# Altium footprint library Connecteurs_Wurth.PcbLib: 33 footprints (part 2 of 3)
Each footprint in its own frame and in the unit in brackets; x right, y up, seen from the top. Pads: shape width x height; smd on the part's side, far side on the other; paste and mask are expansions set on the pad; w line width, h text height; cw(c..) or ccw(c..) is an arc to the next point about the centre after c.
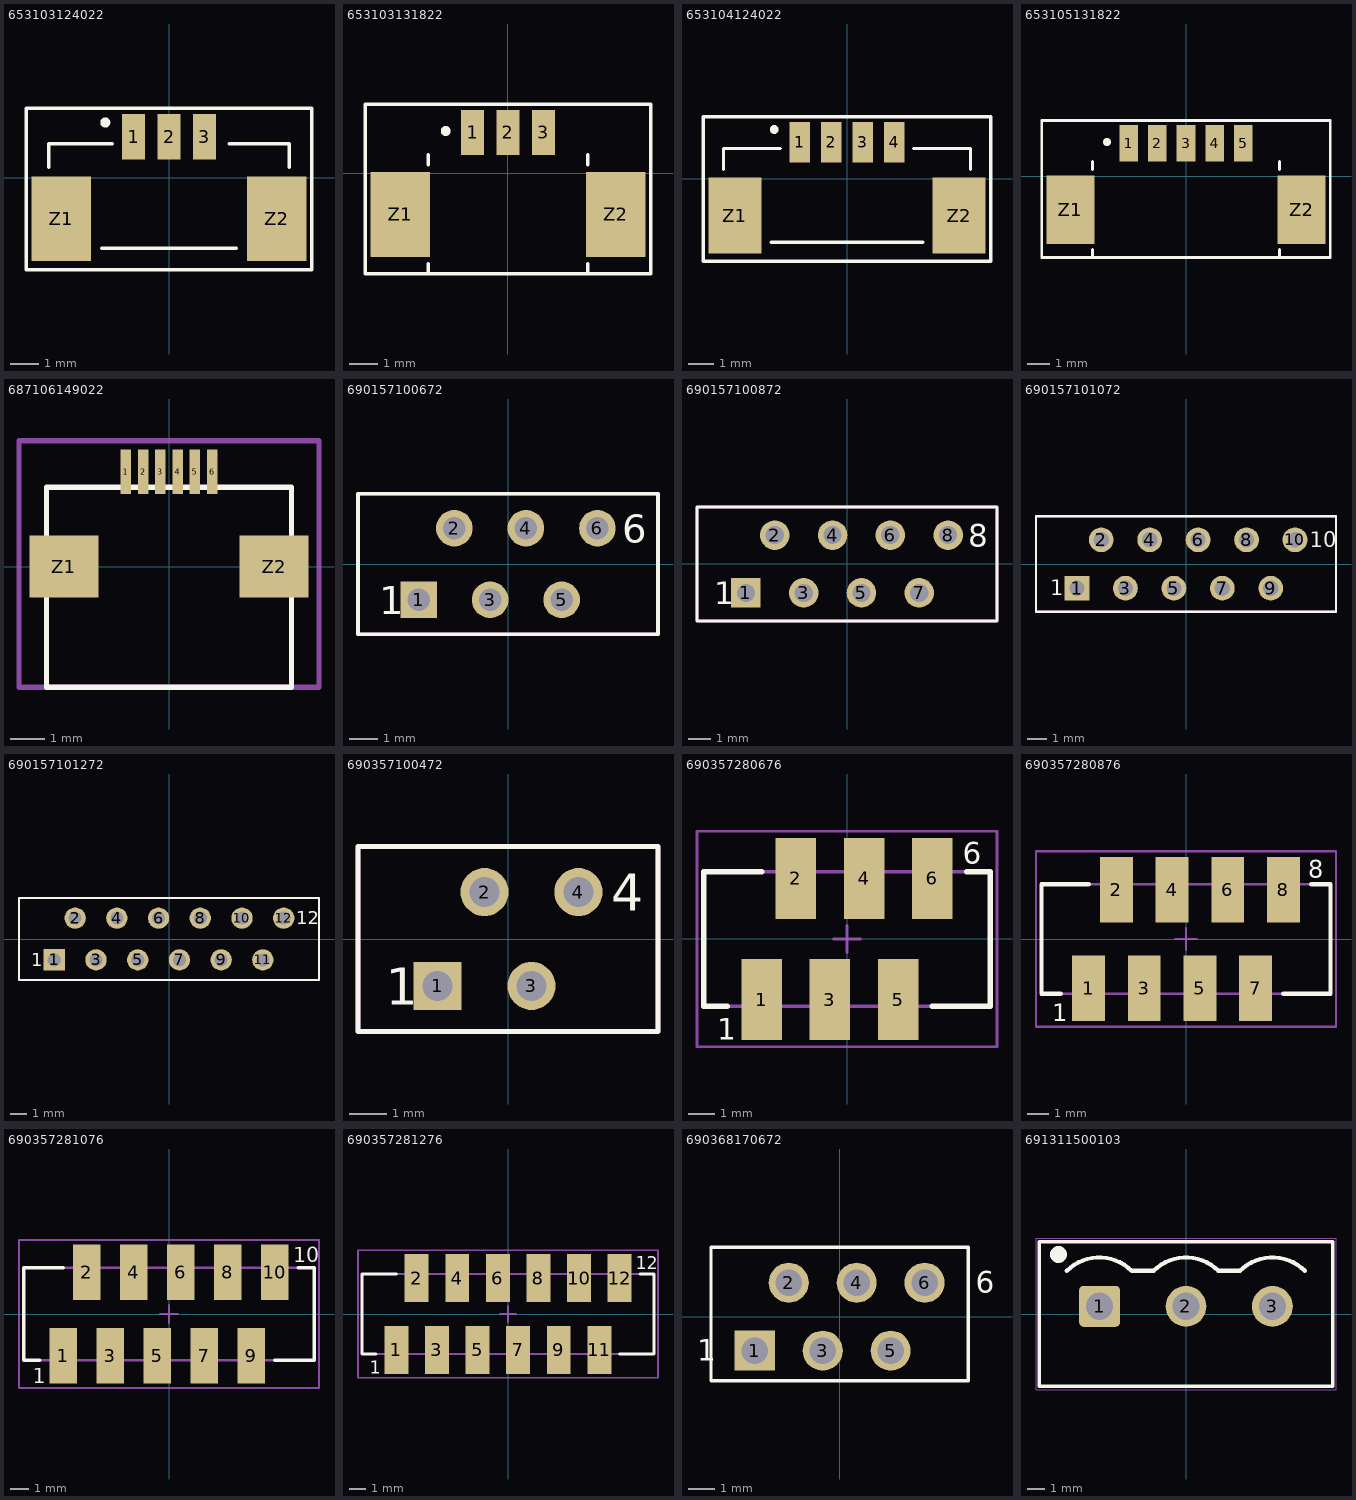
[diagram p1: the footprints below, top view; thin cyan lines are the x and y axes]

## 653103124022 [mm] "SMT Male Vertical Shrouded Header - 02p 1 row - T & R packaging"
height 4.75
pads (5):
  rect 0.81x1.6 smd: 1(-1.25,1.45) 2(0,1.45) 3(1.25,1.45)
  rect 2.1x3 smd: Z1(-3.8,-1.45) Z2(3.8,-1.45)
Top Overlay:
  circle w0.2: c-2.25,1.95 r0.075
  lines w0.127: -4.25,0.375 -4.25,1.2 -2,1.2 ; -2.375,-2.5 2.375,-2.5 ; 2.125,1.2 4.25,1.2 4.25,0.375 ; -5.05,-3.25 5.05,-3.25 5.05,2.45 -5.05,2.45 -5.05,-3.25
Mechanical 13:
  text ".Designator" at -4.826,-2.032 h2
3D body "653103124022.stp": height 4.97, standoff -0.03, extent -4.25,-2.5 4.25,1.705

## 653103131822 [mm] "SMT Male Horizontal Shrouded Header - 03p 1 row - T & R packaging"
height 3.4
pads (5):
  rect 0.81x1.6 smd: 1(-1.25,1.45) 2(0,1.45) 3(1.25,1.45)
  rect 2.1x3 smd: Z1(-3.8,-1.45) Z2(3.8,-1.45)
Top Overlay:
  circle w0.2: c-2.2,1.5 r0.075
  lines w0.127: -2.825,-3.55 -2.825,-3.2 ; -2.825,0.3 -2.825,0.65 ; 2.825,-3.55 2.825,-3.2 ; 2.825,0.3 2.825,0.65 ; -5.05,-3.55 5.05,-3.55 5.05,2.45 -5.05,2.45 -5.05,-3.55
Mechanical 13:
  text ".Designator" at -4.953,-2.667 h2
3D body "653103131822.stp": height 3.38, standoff -0.03, extent -4.25,-3.5 4.25,1.91

## 653104124022 [mm] "SMT Male Vertical Shrouded Header - 02p 1 row - T & R packaging"
height 4.75
pads (6):
  rect 0.81x1.6 smd: 1(-1.875,1.45) 2(-0.625,1.45) 3(0.625,1.45) 4(1.875,1.45)
  rect 2.1x3 smd: Z1(-4.425,-1.45) Z2(4.425,-1.45)
Top Overlay:
  circle w0.2: c-2.875,1.95 r0.075
  lines w0.127: -4.875,0.375 -4.875,1.2 -2.625,1.2 ; -3,-2.5 3,-2.5 ; 2.625,1.2 4.875,1.2 4.875,0.375 ; -5.675,-3.25 -5.675,2.45 5.675,2.45 5.675,-3.25 -5.675,-3.25
Mechanical 13:
  text ".Designator" at -4.953,-2.667 h2
3D body "653104124022.stp": height 4.97, standoff -0.03, extent -4.875,-2.5 4.875,1.705

## 653105131822 [mm] "SMT Male Horizontal Shrouded Header - 05p 1 row - T & R packaging"
height 3.4
pads (7):
  rect 0.81x1.6 smd: 1(-2.5,1.45) 2(-1.25,1.45) 3(0,1.45) 4(1.25,1.45) 5(2.5,1.45)
  rect 2.1x3 smd: Z1(-5.05,-1.45) Z2(5.05,-1.45)
Top Overlay:
  circle w0.2: c-3.45,1.5 r0.075
  lines w0.127: -4.075,-3.55 -4.075,-3.2 ; -4.075,0.3 -4.075,0.65 ; 4.075,-3.55 4.075,-3.2 ; 4.075,0.3 4.075,0.65 ; -6.3,-3.55 6.3,-3.55 6.3,2.45 -6.3,2.45 -6.3,-3.55
Mechanical 13:
  text ".Designator" at -4.953,-2.667 h2
3D body "653105131822.stp": height 3.38, standoff -0.03, extent -5.5,-3.5 5.5,1.91

## 687106149022 [mm] "WR-FPC 0.50mm SMT Horiz. Bot. Contact Hinge type WR-FPC 0.50mm 6pins Hinge type SMT Horizontal Bottom Contact"
pads (8):
  rect 0.3x1.3 smd: 1(-1.25,2.75) 2(-0.75,2.75) 3(-0.25,2.75) 4(0.25,2.75) 5(0.75,2.75) 6(1.25,2.75)
  rect 2x1.8 smd: Z1(-3.05,0) Z2(3.05,0)
Top Overlay:
  lines w0.152: -3.55,-3.5 -3.55,2.3 3.55,2.3 3.55,-3.5 -3.55,-3.5
Mechanical 13:
  text ".Designator" at -4.933,-2.33 h2
Mechanical 15:
  lines w0.152: 3.55,-3.5 -4.35,-3.5 ; -4.35,-3.5 -4.35,3.65 4.35,3.65 4.35,-3.5 -4.35,-3.5
3D body "687106149022.stp": height 2.25, standoff 0, extent -3.55,-3.5 3.55,3

## 690157100672 [mm] "6 pins, straight"
height 7
pads (6):
  rect 1.3x1.3 hole 0.8: 1(-3.175,-1.27)
  round 1.3 hole 0.8: 2(-1.905,1.27) 3(-0.635,-1.27) 4(0.635,1.27) 5(1.905,-1.27) 6(3.175,1.27)
Top Overlay:
  lines w0.127: -5.325,-2.5 -5.325,2.5 ; -5.325,-2.5 5.325,-2.5 ; -5.325,-2.5 5.325,-2.5 ; -5.325,-2.5 -5.325,2.5 ; -5.325,2.5 5.325,2.5 ; -5.325,2.5 5.325,2.5 ; 5.325,-2.5 5.325,2.5 ; 5.325,-2.5 5.325,2.5
  text "1" at -4.572,-1.778 h1
  text "6" at 4.064,0.762 h1
Mechanical 13:
  lines w0.127: -5.325,-2.5 -5.325,2.5 5.325,2.5 5.325,-2.5 -5.325,-2.5
  text ".Designator" at -4.953,-0.508 h2
3D body "690357100672.stp": height 7.5, standoff -2.6, extent -5.325,-2.5 5.325,2.5

## 690157100872 [mm] "8 pins, straight"
height 7
pads (8):
  rect 1.3x1.3 hole 0.8: 1(-4.445,-1.27)
  round 1.3 hole 0.8: 2(-3.175,1.27) 3(-1.905,-1.27) 4(-0.635,1.27) 5(0.635,-1.27) 6(1.905,1.27) 7(3.175,-1.27) 8(4.445,1.27)
Top Overlay:
  lines w0.127: -6.595,-2.5 -6.595,2.5 6.595,2.5 6.595,-2.5 -6.595,-2.5
  text "8" at 5.334,0.762 h1
  text "1" at -5.842,-1.778 h1
Mechanical 13:
  lines w0.127: -6.595,-2.5 -6.595,2.5 6.595,2.5 6.595,-2.5 -6.595,-2.5
  text ".Designator" at -5.969,-0.381 h2
3D body "690357100872.stp": height 7.2, standoff -2.9, extent -6.595,-2.5 6.595,2.5

## 690157101072 [mm] "10 pins, straight"
height 7
pads (10):
  rect 1.3x1.3 hole 0.8: 1(-5.715,-1.27)
  round 1.3 hole 0.8: 2(-4.445,1.27) 3(-3.175,-1.27) 4(-1.905,1.27) 5(-0.635,-1.27) 6(0.635,1.27) 7(1.905,-1.27) 8(3.175,1.27) 9(4.445,-1.27) 10(5.715,1.27)
Top Overlay:
  lines w0.127: -7.865,-2.5 7.865,-2.5 ; -7.865,-2.5 -7.865,2.5 ; -7.865,-2.5 7.865,-2.5 ; -7.865,-2.5 -7.865,2.5 ; -7.865,2.5 7.865,2.5 ; -7.865,2.5 7.865,2.5 ; 7.865,-2.5 7.865,2.5 ; 7.865,-2.5 7.865,2.5
  text "10" at 6.477,0.889 h0.8
  text "1" at -7.112,-1.651 h0.8
Mechanical 13:
  lines w0.127: -7.865,-2.5 7.865,-2.5 7.865,2.5 -7.865,2.5 -7.865,-2.5
  text ".Designator" at -5.588,-0.381 h2
3D body "690357101072.stp": height 7.2, standoff -2.9, extent -7.865,-2.5 7.865,2.5

## 690157101272 [mm] "12 pins, straight"
height 7
pads (12):
  rect 1.3x1.3 hole 0.8: 1(-6.985,-1.27)
  round 1.3 hole 0.8: 2(-5.715,1.27) 3(-4.445,-1.27) 4(-3.175,1.27) 5(-1.905,-1.27) 6(-0.635,1.27) 7(0.635,-1.27) 8(1.905,1.27) 9(3.175,-1.27) 10(4.445,1.27) 11(5.715,-1.27) 12(6.985,1.27)
Top Overlay:
  lines w0.127: -9.135,-2.5 -9.135,2.5 9.135,2.5 9.135,-2.5 -9.135,-2.5
  text "12" at 7.747,0.889 h0.8
  text "1" at -8.382,-1.651 h0.8
Mechanical 13:
  lines w0.127: -9.135,-2.5 9.135,-2.5 9.135,2.5 -9.135,2.5 -9.135,-2.5
  text ".Designator" at -5.207,-0.254 h2
3D body "690357101272.stp": height 7.2, standoff -2.9, extent -9.135,-2.5 9.135,2.5

## 690357100472 [mm] "4 pins, straight"
height 7
pads (4):
  rect 1.3x1.3 hole 0.8: 1(-1.905,-1.27)
  round 1.3 hole 0.8: 2(-0.635,1.27) 3(0.635,-1.27) 4(1.905,1.27)
Top Overlay:
  lines w0.127: -4.055,-2.5 -4.055,2.5 ; -4.055,-2.5 4.055,-2.5 ; -4.055,-2.5 -4.055,2.5 ; -4.055,-2.5 4.055,-2.5 ; -4.055,2.5 4.055,2.5 ; -4.055,2.5 4.055,2.5 ; 4.055,-2.5 4.055,2.5 ; 4.055,-2.5 4.055,2.5
  text "1" at -3.302,-1.778 h1
  text "4" at 2.794,0.762 h1
Mechanical 13:
  lines w0.127: -4.055,-2.5 4.055,-2.5 4.055,2.5 -4.055,2.5 -4.055,-2.5
  text ".Designator" at -5.842,-0.381 h2
3D body "690357100472.stp": height 7.2, standoff -2.9, extent -4.055,-2.5 4.055,2.5

## 690357280676 [mm] "6 pins, SMT, straight"
height 4.6
pads (6):
  rect 1.5x3 smd: 1(-3.175,-2.25) 2(-1.905,2.25) 3(-0.635,-2.25) 4(0.635,2.25) 5(1.905,-2.25) 6(3.175,2.25)
Top Overlay:
  lines w0.2: -4.445,-2.5 -5.325,-2.5 -5.325,2.5 -3.175,2.5 ; 3.175,-2.5 5.325,-2.5 5.325,2.5 4.445,2.5
  text "6" at 4.309,2.794 h0.8
  text "1" at -4.826,-3.75 h0.8
Mechanical 13:
  lines w0.127: -5.325,-2.5 -5.325,2.5 5.325,2.5 5.325,-2.5 -5.325,-2.5
  text ".Designator" at -5.461,-0.508 h2
Mechanical 15:
  lines w0.1: -0.5,0 0.5,0 ; 0,-0.5 0,0.5 ; -5.575,-4 5.575,-4 5.575,4 -5.575,4 -5.575,-4
3D body "690357280676.stp": height 5.15, standoff 0, extent -5.325,-3.25 5.325,3.25

## 690357280876 [mm] "8 pins, SMT, straight"
height 4.6
pads (8):
  rect 1.5x3 smd: 1(-4.445,-2.25) 2(-3.175,2.25) 3(-1.905,-2.25) 4(-0.635,2.25) 5(0.635,-2.25) 6(1.905,2.25) 7(3.175,-2.25) 8(4.445,2.25)
Top Overlay:
  lines w0.2: -5.715,-2.5 -6.595,-2.5 -6.595,2.5 -4.445,2.5 ; 4.445,-2.5 6.595,-2.5 6.595,2.5 5.715,2.5
  text "1" at -6.096,-3.75 h0.8
  text "8" at 5.579,2.794 h0.8
Mechanical 13:
  lines w0.127: -6.595,-2.5 -6.595,2.5 6.595,2.5 6.595,-2.5 -6.595,-2.5
  text ".Designator" at -5.461,-0.381 h2
Mechanical 15:
  lines w0.1: -0.5,0 0.5,0 ; 0,-0.5 0,0.5 ; -6.845,-4 6.845,-4 6.845,4 -6.845,4 -6.845,-4
3D body "690357280876.stp": height 5.15, standoff 0, extent -6.595,-3.25 6.595,3.25

## 690357281076 [mm] "10 pins, SMT, straight"
height 4.6
pads (10):
  rect 1.5x3 smd: 1(-5.715,-2.25) 2(-4.445,2.25) 3(-3.175,-2.25) 4(-1.905,2.25) 5(-0.635,-2.25) 6(0.635,2.25) 7(1.905,-2.25) 8(3.175,2.25) 9(4.445,-2.25) 10(5.715,2.25)
Top Overlay:
  lines w0.2: -6.985,-2.5 -7.865,-2.5 -7.865,2.5 -5.715,2.5 ; 5.715,-2.5 7.865,-2.5 7.865,2.5 6.985,2.5
  text "10" at 6.722,2.794 h0.8
  text "1" at -7.366,-3.75 h0.8
Mechanical 13:
  lines w0.127: -7.865,-2.5 -7.865,2.5 7.865,2.5 7.865,-2.5 -7.865,-2.5
  text ".Designator" at -5.715,-0.381 h2
Mechanical 15:
  lines w0.1: -0.5,0 0.5,0 ; 0,-0.5 0,0.5 ; -8.115,-4 -8.115,4 8.115,4 8.115,-4 -8.115,-4
3D body "690357281076.stp": height 5.15, standoff 0, extent -7.865,-3.25 7.865,3.25

## 690357281276 [mm] "12 pins, SMT, straight"
height 4.6
pads (12):
  rect 1.5x3 smd: 1(-6.985,-2.25) 2(-5.715,2.25) 3(-4.445,-2.25) 4(-3.175,2.25) 5(-1.905,-2.25) 6(-0.635,2.25) 7(0.635,-2.25) 8(1.905,2.25) 9(3.175,-2.25) 10(4.445,2.25) 11(5.715,-2.25) 12(6.985,2.25)
Top Overlay:
  lines w0.2: -8.255,-2.5 -9.135,-2.5 -9.135,2.5 -6.985,2.5 ; 6.985,-2.5 9.135,-2.5 9.135,2.5 8.255,2.5
  text "12" at 7.992,2.794 h0.8
  text "1" at -8.636,-3.75 h0.8
Mechanical 13:
  lines w0.127: -9.135,-2.5 -9.135,2.5 9.135,2.5 9.135,-2.5 -9.135,-2.5
  text ".Designator" at -5.461,-0.381 h2
Mechanical 15:
  lines w0.1: -0.5,0 0.5,0 ; 0,-0.5 0,0.5 ; -9.385,-4 -9.385,4 9.385,4 9.385,-4 -9.385,-4
3D body "690357281276.stp": height 5.15, standoff 0, extent -9.135,-3.25 9.135,3.25

## 690368170672 [mm] "without Latch, 6 pins, right angled"
height 5.8
pads (6):
  rect 1.5x1.5 hole 1: 1(-3.175,-1.27)
  round 1.5 hole 1: 2(-1.905,1.27) 3(-0.635,-1.27) 4(0.635,1.27) 5(1.905,-1.27) 6(3.175,1.27)
Top Overlay:
  lines w0.127: -4.81,-2.4 -4.81,2.6 4.81,2.6 4.81,-2.4 -4.81,-2.4
  text "1" at -5.334,-1.651 h0.8
  text "6" at 5.08,0.889 h0.8
Mechanical 13:
  text ".Designator" at -4.445,-0.381 h2
3D body "690368170672.stp": height 5.9, standoff -3, extent -4.81,-2.4 4.81,2.6

## 691311500103 [mm] "5,08mm - PCB Headers - Vertical - Closed ends -03p"
height 12
pads (3):
  rrect20% 2.4x2.4 hole 1.6: 1(-5.08,0.45)
  round 2.4 hole 1.6: 2(0,0.45) 3(5.08,0.45)
Top Overlay:
  circle w0.5: c-7.5,3.5 r0.25
  lines w0.2: -8.62,-4.25 -8.62,4.25 8.62,4.25 8.62,-4.25 -8.62,-4.25
  lines w0.254: -7.005,2.54 cw(c-5.1,0.635) -3.195,2.54 -1.925,2.54 ; -1.905,2.54 cw(c0,0.635) 1.905,2.54 3.175,2.54 cw(c5.08,0.635) 6.985,2.54
Mechanical 13:
  lines w0.1: -8.62,-4.25 8.62,-4.25 8.62,4.25 -8.62,4.25 -8.62,-4.25
  text ".Designator" at -4.953,-2.667 h2
Mechanical 15:
  lines w0.05: -0.5,0 0.5,0 ; 0,-0.5 0,0.5 ; -8.82,-4.45 -8.82,4.45 8.82,4.45 8.82,-4.45 -8.82,-4.45
3D body "691311500103.stp": height 12.05, standoff -3.95, extent -8.62,-4.25 8.62,4.25